# Altium footprint library PCBLIB.PcbLib: 775 footprints (part 28 of 49)
Each footprint in its own frame and in the unit in brackets; x right, y up, seen from the top. Pads: shape width x height; smd on the part's side, far side on the other; paste and mask are expansions set on the pad; w line width, h text height; cw(c..) or ccw(c..) is an arc to the next point about the centre after c.
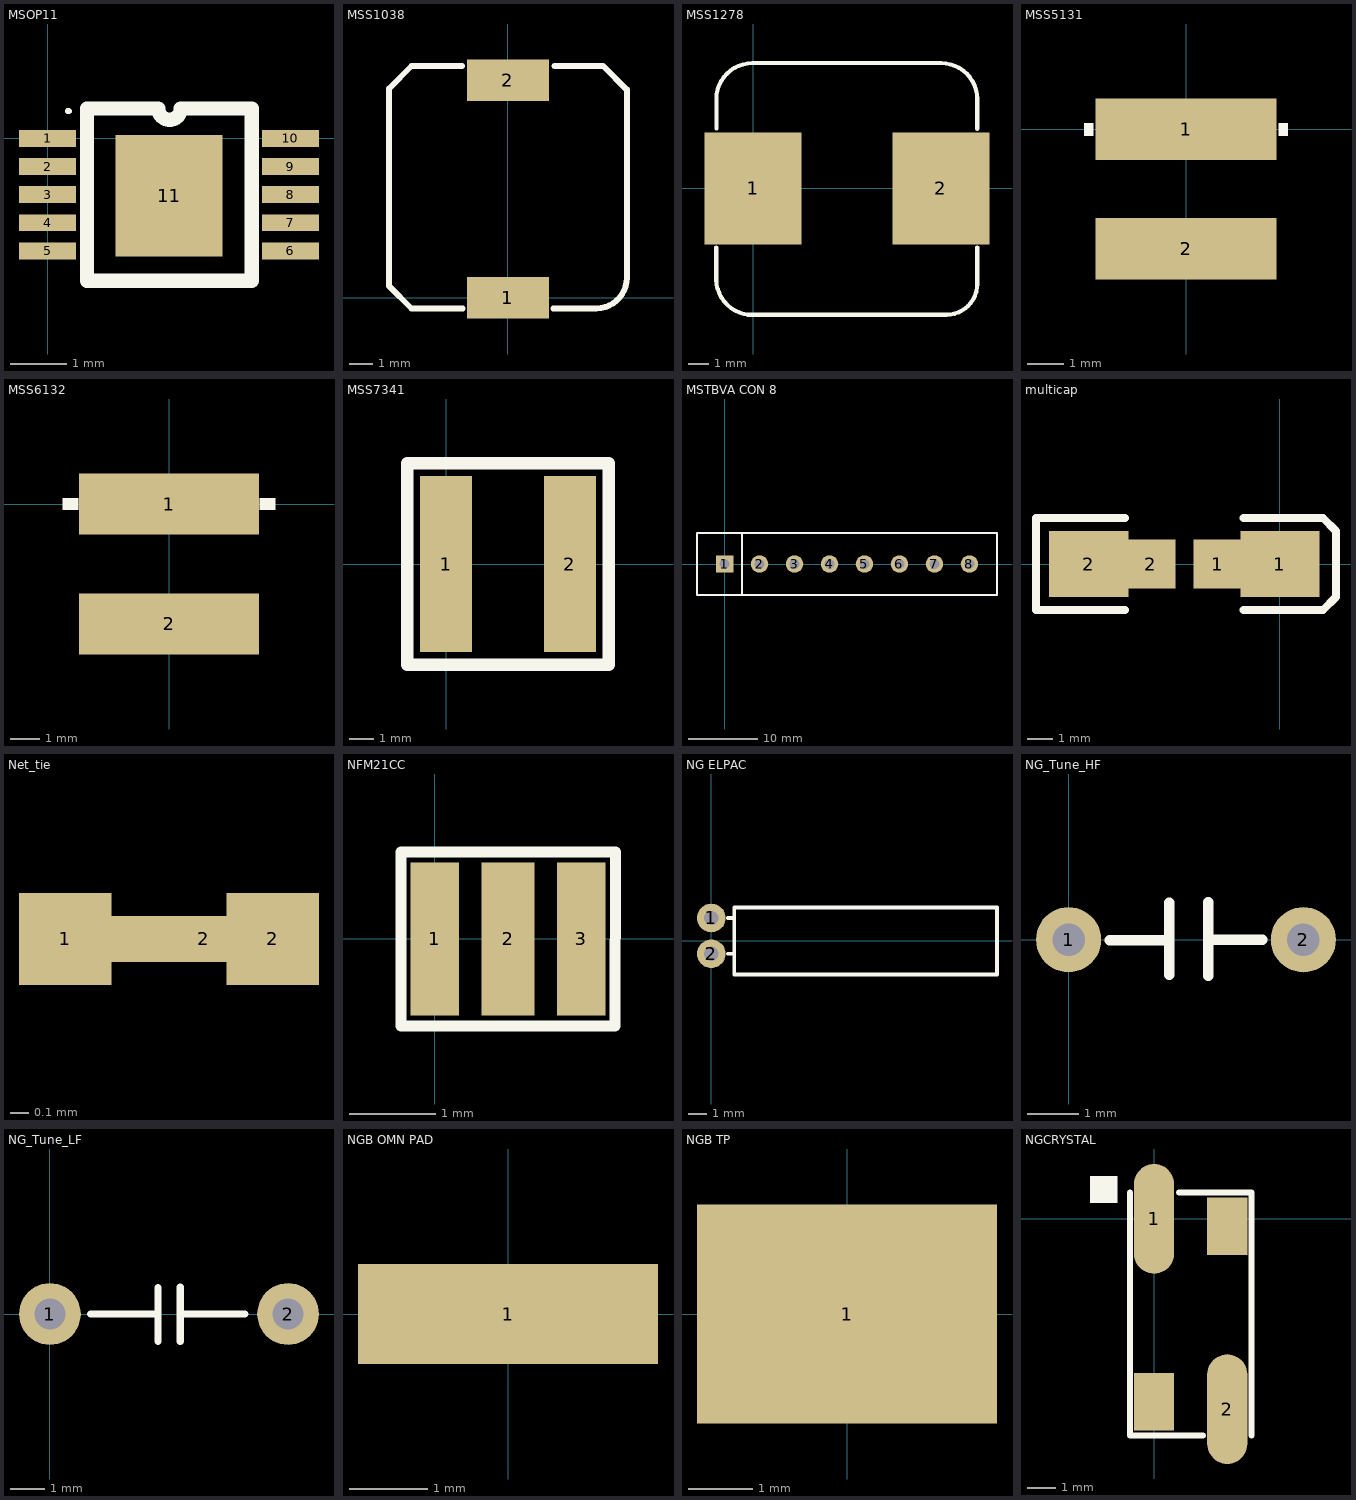
[diagram p27: the footprints below, top view; thin cyan lines are the x and y axes]

## MSOP11 [mm]
height 0.86
pads (11):
  rect 1.016x0.3 smd: 1(0,0) 2(0,-0.5) 3(0,-1) 4(0,-1.5) 5(0,-2) 6(4.318,-2) 7(4.318,-1.5) 8(4.318,-1) 9(4.318,-0.5) 10(4.318,0)
  rect 1.9x2.16 smd: 11(2.159,-1.016)
TopOverlay:
  lines w0.1: 0.356,0.483 cw(c0.368,0.47) 0.381,0.483
  lines w0.254: 0.7,-2.53 0.7,0.53 1.97,0.53 ccw(c2.17,0.53) 2.37,0.53 3.63,0.53 3.63,-2.53 0.7,-2.53
Mechanical4:
  text ".040" at 0,0 h0.03

## MSS1038 [mil]
height 150
pads (2):
  rect 140x70 smd: 1(0,0) 2(0,370)
TopOverlay:
  lines w10: -78,394 -163.98,394 -202,355.98 -202,19.84 -164.16,-18 -77,-18 ; 77,-18 150.66,-18 ccw(c149.92,34.08) 202,33.9 202,353.99 ; 79,394 161.81,394 202,353.81

## MSS1278 [mil]
pads (2):
  rect 187x217 smd: 1(0,0) 2(364,0)
TopOverlay:
  lines w5: -9.58,-244.66 -9.44,-244.8
  lines w8: -71.26,-114.26 -71.26,-177.14 ccw(c-1.28,-175.19) -8.53,-244.81 ; -71.08,116.08 -71.08,172.59 cw(c-1.08,172.57) -1.29,242.57 364.63,242.57 cw(c364.36,172.57) 434.35,172.77 434.35,115.35 ; -9.44,-244.8 7.06,-244.8 374.54,-244.8 ccw(c374.63,-185.17) 434.26,-185.17 434.26,-114.26

## MSS5131 [mil]
height 108
pads (2):
  rect 197x67 smd: 1(0,0) 2(0,-130)
TopOverlay:
  region: 111,-7 111,7 101,7 101,-7
  region: -101,-7 -101,7 -111,7 -111,-7

## MSS6132 [mil]
pads (2):
  rect 237x80 smd: 1(0,0) 2(0,-158)
TopOverlay:
  rectangle: -140,-8 -119,8
  rectangle: 119,-8 140,8

## MSS7341 [mil]
height 4.1
pads (2):
  rect 83x280 smd: 1(0,0) 2(197,0)
TopOverlay:
  lines w20: -61.5,-160 -61.5,160 258.5,160 258.5,-160 -61.5,-160

## MSTBVA CON 8 [mm]
height 9.906
pads (8):
  rect 2.54x2.54 hole 1.4: 1(0,0)
  round 2.54 hole 1.4: 2(5.08,0) 3(10.16,0) 4(15.24,0) 5(20.32,0) 6(25.4,0) 7(30.48,0) 8(35.56,0)
TopOverlay:
  lines w0.305: 2.54,-4.5 2.54,4.5 ; -4,-4.5 39.56,-4.5 39.56,4.5 -4,4.5 -4,-4.5
Mechanical4:
  text ".300" at 0,0 h0.03
  text ".358" at 0,-0.025 h0.03

## multicap [mil]
pads (4):
  rect 75x75 smd: 1(-94,0) 2(-196,0)
  rect 120x100 smd: 1(0,0) 2(-290,0)
TopOverlay:
  lines w12: -235,-70 -370,-70 -370,70 -235,70 ; -55,-70 65,-70 85,-50 85,50 65,70 -55,70
Mechanical4:
  text ".1" at 0,0 h1

## Net_tie [mil]
pads (3):
  rect 20x20 smd: 1(2870,840) 2(2915,840)
  rect 40x10 smd: 2(2900,840)

## NFM21CC [mil]
height 33.5
pads (3):
  rect 22x70 smd: 1(0,0) 3(66.93,0)
  rect 24x70 smd: 2(33.46,0)
TopOverlay:
  lines w5: -15.37,-39.68 82.39,-39.81 82.52,39.75 -15.37,39.75 -15.37,-31.44 -15.37,-39.68

## NG ELPAC [mil]
height 310
pads (2):
  round 60 hole 30: 1(0,48) 2(0,-27)
TopOverlay:
  lines w8: 35,-27 48,-27 ; 35,48 48,48 ; 48,-70 48,70 598,70 598,-70 48,-70

## NG_Tune_HF [mil]
height 185
pads (2):
  round 50 hole 25: 1(0,0) 2(180,0)
TopOverlay:
  lines w8: 31.69,-0.39 77.12,-0.39 ; 77.12,-26.92 77.12,-0.39 ; 77.12,28.44 77.12,-0.39 ; 107.07,-27.72 107.07,-0.04 ; 107.07,28.79 107.07,-0.04 ; 148.4,-0.04 107.07,-0.04

## NG_Tune_LF [mil]
height 440
pads (2):
  round 70 hole 35: 1(0,0) 2(270,0)
TopOverlay:
  lines w8: 46.26,0.13 122.38,0.13 ; 122.38,-31.29 122.38,0.13 ; 122.38,30.12 122.38,0.13 ; 147.75,-31.01 147.75,0.13 ; 147.75,30.41 147.75,0.13 ; 221.27,0.13 147.75,0.13

## NGB OMN PAD [mil]
height 1
pads (1):
  rect 150x50 smd: 1(0,0)

## NGB TP [mil]
height 90
pads (1):
  rect 185x135 smd: 1(0,0)

## NGCRYSTAL [mil]
height 74
pads (4):
  oval 55x150 smd: 1(0,0) 2(100,-260)
  rect 55x79 smd: ""(0,-250) ""(100,-10)
TopOverlay:
  rectangle: -87.8,21.89 -50,58.5
  lines w8: -33,36 -33,-296 67,-296 ; 34,36 133,36 133,-296